# Altium footprint library pi4.PcbLib: 46 footprints (part 2 of 3)
Each footprint in its own frame and in the unit in brackets; x right, y up, seen from the top. Pads: shape width x height; smd on the part's side, far side on the other; paste and mask are expansions set on the pad; w line width, h text height; cw(c..) or ccw(c..) is an arc to the next point about the centre after c.
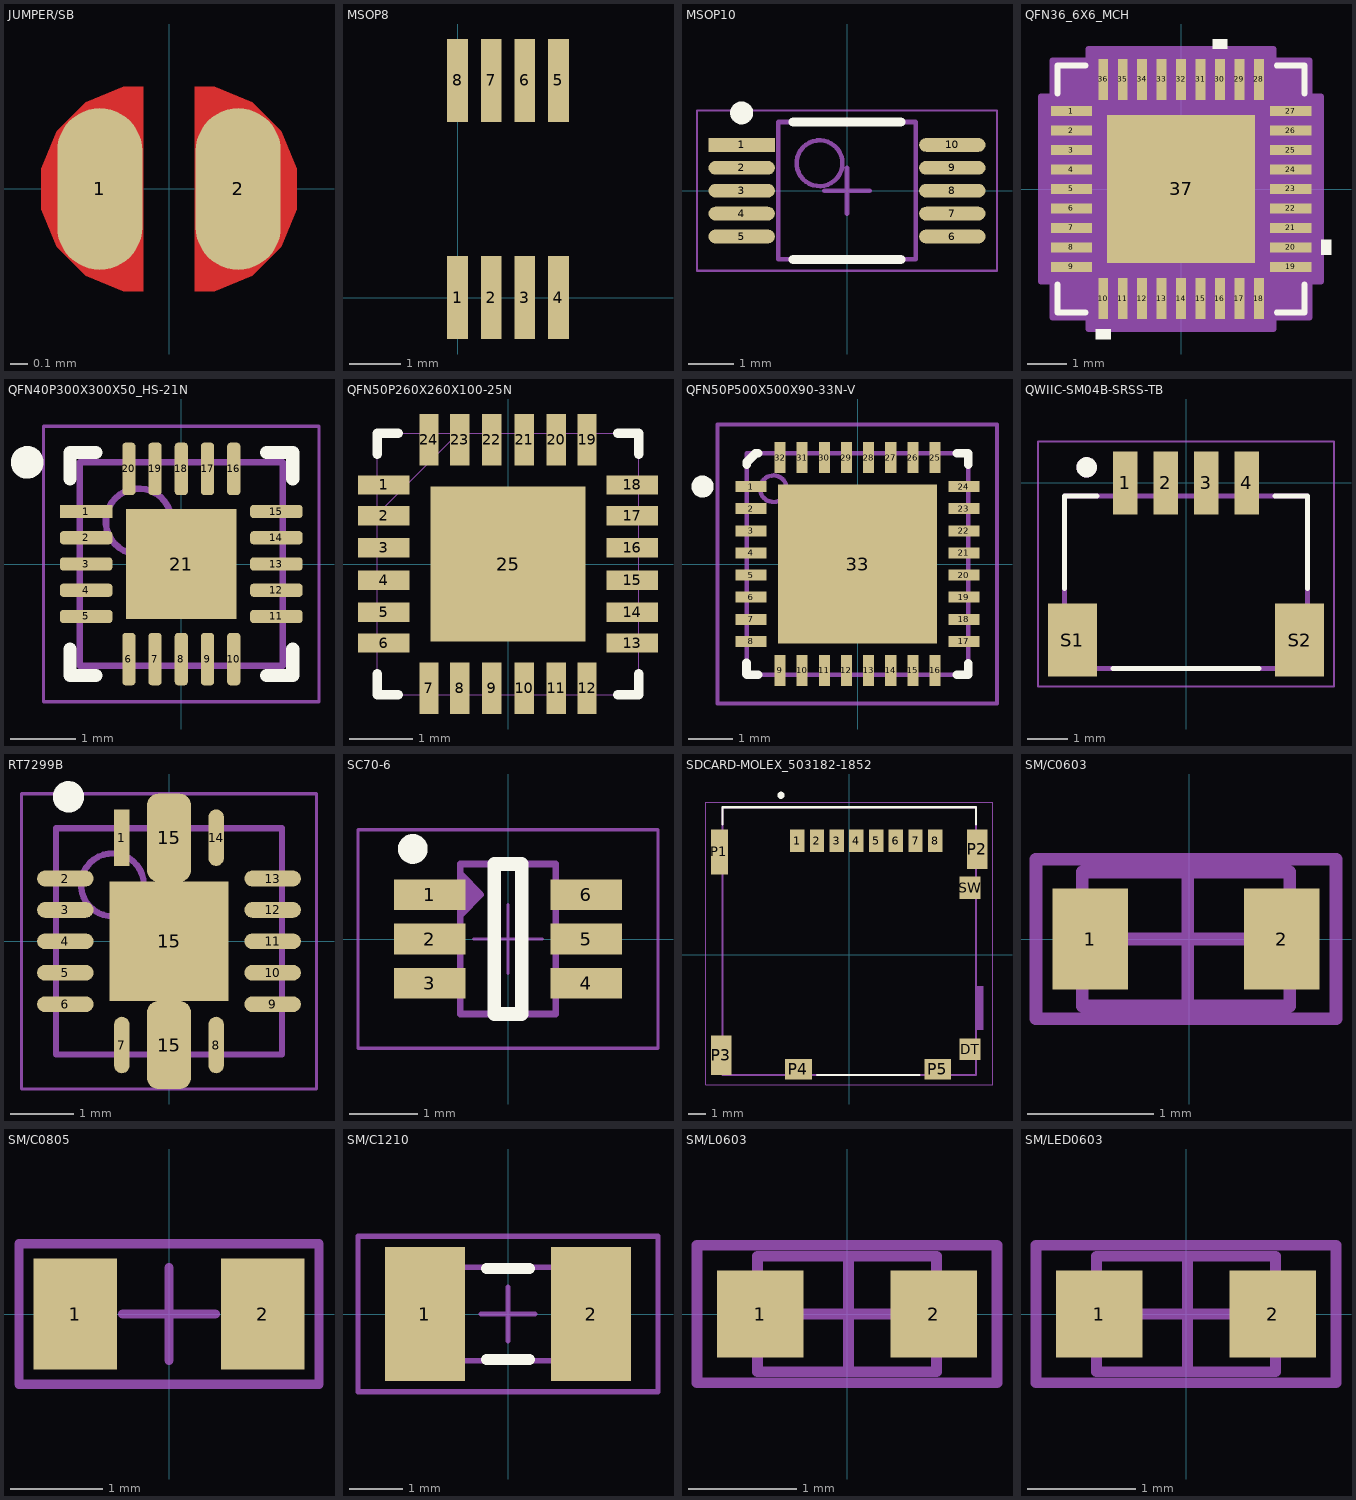
[diagram p1: the footprints below, top view; thin cyan lines are the x and y axes]

## JUMPER/SB [mm]
height 1
pads (2):
  oval 0.5x0.95 smd mask+0.102: 1(-0.406,0) 2(0.406,0)
Top Layer:
  region: 0.15,-0.6 0.269,-0.6 0.49,-0.509 0.659,-0.34 0.75,-0.119 0.75,0.119 0.659,0.34 0.49,0.509 0.269,0.6 0.15,0.6
  region: -0.15,0.6 -0.269,0.6 -0.49,0.509 -0.659,0.34 -0.75,0.119 -0.75,-0.119 -0.659,-0.34 -0.49,-0.509 -0.269,-0.6 -0.15,-0.6
Top Solder:
  region: -0.147,-0.7 0.156,-0.7 0.15,-0.7 0.242,-0.7 0.42,-0.652 0.58,-0.56 0.71,-0.43 0.802,-0.27 0.85,-0.092 0.85,0.092 0.802,0.27 0.71,0.43 0.58,0.56 0.42,0.652 0.242,0.7 0.15,0.7 0.158,0.699 -0.146,0.699 -0.15,0.7 -0.242,0.7 -0.42,0.652 -0.58,0.56 -0.71,0.43 -0.802,0.27 -0.85,0.092 -0.85,-0.092 -0.802,-0.27 -0.71,-0.43 -0.58,-0.56 -0.42,-0.652 -0.242,-0.7 -0.15,-0.7

## MSOP8 [mm]
pads (8):
  rect 0.4x1.6 smd: 1(0,0) 2(0.65,0) 3(1.3,0) 4(1.95,0) 5(1.95,4.2) 6(1.3,4.2) 7(0.65,4.2) 8(0,4.2)
3D body "MSOP8.STEP": height 1.15, standoff 0, extent -0.535,-0.342 2.465,4.558

## MSOP10 [mm] "TSSOP, 10-Leads, Body 3.00x3.00mm, Pitch 0.50mm, Thermal Pad 1.68.2x1.68.2mm, IPC Medium Density"
height 1.1
pads (10):
  rect 1.45x0.3 smd: 1(-2.3,1)
  oval 1.45x0.3 smd: 2(-2.3,0.5) 3(-2.3,0) 4(-2.3,-0.5) 5(-2.3,-1) 6(2.3,-1) 7(2.3,-0.5) 8(2.3,0) 9(2.3,0.5) 10(2.3,1)
Top Overlay:
  circle w0.25: c-2.3,1.7 r0.125
  lines w0.2: -1.175,-1.5 1.175,-1.5 ; -1.175,1.5 1.175,1.5
Mechanical 13:
  circle w0.1: c-0.6,0.6 r0.5
  lines w0.1: -1.5,-1.5 -1.5,1.5 1.5,1.5 1.5,-1.5 -1.5,-1.5
Mechanical 15:
  lines w0.05: -3.275,-1.75 -3.275,1.75 3.275,1.75 3.275,-1.75 -3.275,-1.75
  lines w0.1: -0.5,0 0.5,0 ; 0,-0.5 0,0.5
3D body "MSOP10.STEP": height 1.15, standoff 0, extent -2.45,-1.5 2.45,1.5

## QFN36_6X6_MCH [mm]
pads (37):
  rect 1.062x0.255 smd paste+0 mask+0: 1(-2.817,2) 2(-2.817,1.5) 3(-2.817,1) 4(-2.817,0.5) 5(-2.817,0) 6(-2.817,-0.5) 7(-2.817,-1) 8(-2.817,-1.5) 9(-2.817,-2) 19(2.817,-2) 20(2.817,-1.5) 21(2.817,-1) 22(2.817,-0.5) 23(2.817,0) 24(2.817,0.5) 25(2.817,1) 26(2.817,1.5) 27(2.817,2)
  rect 0.255x1.062 smd paste+0 mask+0: 10(-2,-2.817) 11(-1.5,-2.817) 12(-1,-2.817) 13(-0.5,-2.817) 14(0,-2.817) 15(0.5,-2.817) 16(1,-2.817) 17(1.5,-2.817) 18(2,-2.817) 28(2,2.817) 29(1.5,2.817) 30(1,2.817) 31(0.5,2.817) 32(0,2.817) 33(-0.5,2.817) 34(-1,2.817) 35(-1.5,2.817) 36(-2,2.817)
  rect 3.81x3.81 smd paste-1.892 mask+0: 37(0,0)
Top Overlay:
  region: 1.191,3.602 0.81,3.602 0.81,3.856 1.191,3.856
  region: 3.602,-1.309 3.856,-1.309 3.856,-1.69 3.602,-1.69
  region: -1.81,-3.602 -2.191,-3.602 -2.191,-3.856 -1.81,-3.856
  lines w0.152: -3.175,-2.46 -3.175,-3.175 -2.46,-3.175 ; -3.175,2.46 -3.175,3.175 -2.46,3.175 ; 2.46,-3.175 3.175,-3.175 3.175,-2.46 ; 2.46,3.175 3.175,3.175 3.175,2.46
Top Paste:
  region: 1.805,1.805 0.735,1.805 0.735,0.735 1.805,0.735
  region: 0.535,1.805 -0.535,1.805 -0.535,0.735 0.535,0.735
  region: 1.805,0.535 0.735,0.535 0.735,-0.535 1.805,-0.535
  region: 1.805,-0.735 0.735,-0.735 0.735,-1.805 1.805,-1.805
  region: 0.535,0.535 -0.535,0.535 -0.535,-0.535 0.535,-0.535
  region: -0.735,0.535 -1.805,0.535 -1.805,-0.535 -0.735,-0.535
  region: -0.735,1.805 -1.805,1.805 -1.805,0.735 -0.735,0.735
  region: 0.535,-0.735 -0.535,-0.735 -0.535,-1.805 0.535,-1.805
  region: -0.735,-0.735 -1.805,-0.735 -1.805,-1.805 -0.735,-1.805
Mechanical 13:
  lines w0.025: -3.048,1.778 -1.778,3.048 ; -3.048,-3.048 3.048,-3.048 3.048,3.048 -3.048,3.048 -3.048,-3.048 ; -3.048,-2.152 -3.048,-1.848 -3.048,-2.152 ; -3.048,-1.652 -3.048,-1.348 -3.048,-1.652 ; -3.048,-1.152 -3.048,-0.848 -3.048,-1.152 ; -3.048,-0.652 -3.048,-0.348 -3.048,-0.652 ; -3.048,-0.152 -3.048,0.152 -3.048,-0.152 ; -3.048,0.348 -3.048,0.652 -3.048,0.348 ; -3.048,0.848 -3.048,1.152 -3.048,0.848 ; -3.048,1.348 -3.048,1.652 -3.048,1.348 ; -3.048,1.848 -3.048,2.152 -3.048,1.848 ; -2.152,-3.048 -1.848,-3.048 -2.152,-3.048 ; -2.152,3.048 -1.848,3.048 -2.152,3.048 ; -1.652,-3.048 -1.348,-3.048 -1.652,-3.048 ; -1.652,3.048 -1.348,3.048 -1.652,3.048 ; -1.152,-3.048 -0.848,-3.048 -1.152,-3.048 ; -1.152,3.048 -0.848,3.048 -1.152,3.048 ; -0.652,-3.048 -0.348,-3.048 -0.652,-3.048 ; -0.652,3.048 -0.348,3.048 -0.652,3.048 ; -0.152,-3.048 0.152,-3.048 -0.152,-3.048 ; -0.152,3.048 0.152,3.048 -0.152,3.048 ; 0.348,-3.048 0.652,-3.048 0.348,-3.048 ; 0.348,3.048 0.652,3.048 0.348,3.048 ; 0.848,-3.048 1.152,-3.048 0.848,-3.048 ; 0.848,3.048 1.152,3.048 0.848,3.048 ; 1.348,-3.048 1.652,-3.048 1.348,-3.048 ; 1.348,3.048 1.652,3.048 1.348,3.048 ; 1.848,-3.048 2.152,-3.048 1.848,-3.048 ; 1.848,3.048 2.152,3.048 1.848,3.048 ; 3.048,-2.152 3.048,-1.848 3.048,-2.152 ; 3.048,-1.652 3.048,-1.348 3.048,-1.652 ; 3.048,-1.152 3.048,-0.848 3.048,-1.152 ; 3.048,-0.652 3.048,-0.348 3.048,-0.652 ; 3.048,-0.152 3.048,0.152 3.048,-0.152 ; 3.048,0.348 3.048,0.652 3.048,0.348 ; 3.048,0.848 3.048,1.152 3.048,0.848 ; 3.048,1.348 3.048,1.652 3.048,1.348 ; 3.048,1.848 3.048,2.152 3.048,1.848
  text "*" at -2.603,1.615 h1.27
Mechanical 15:
  region: -2.381,-3.302 -3.302,-3.302 -3.302,-2.381 -3.602,-2.381 -3.602,2.381 -3.302,2.381 -3.302,3.302 -2.381,3.302 -2.381,3.602 2.381,3.602 2.381,3.302 3.302,3.302 3.302,2.381 3.602,2.381 3.602,-2.381 3.302,-2.381 3.302,-3.302 2.381,-3.302 2.381,-3.602 -2.381,-3.602
  lines w0.152: -3.602,-2.381 -3.602,2.381 -3.302,2.381 -3.302,3.302 -2.381,3.302 -2.381,3.602 2.381,3.602 2.381,3.302 3.302,3.302 3.302,2.381 3.602,2.381 3.602,-2.381 3.302,-2.381 3.302,-3.302 2.381,-3.302 2.381,-3.602 -2.381,-3.602 -2.381,-3.302 -3.302,-3.302 -3.302,-2.381 -3.602,-2.381
3D body: height 0.25, standoff 0, extent 0,0 0.254,0.254
3D body "SQFN36_6X6_MCH.STEP": height 0.99, standoff 0, extent -3.048,-3.048 3.048,3.048

## QFN40P300X300X50_HS-21N [mm] "QFN, 20-Leads, Body 3.00x3.00mm, Pitch 0.40mm, Thermal Pad 1.68x1.68mm, IPC Medium Density"
height 0.5
pads (21):
  rect 0.8x0.2 smd: 1(-1.45,0.8)
  rrect50% 0.8x0.2 smd: 2(-1.45,0.4) 3(-1.45,0) 4(-1.45,-0.4) 5(-1.45,-0.8) 11(1.45,-0.8) 12(1.45,-0.4) 13(1.45,0) 14(1.45,0.4) 15(1.45,0.8)
  rrect50% 0.2x0.8 smd: 6(-0.8,-1.45) 7(-0.4,-1.45) 8(0,-1.45) 9(0.4,-1.45) 10(0.8,-1.45) 16(0.8,1.45) 17(0.4,1.45) 18(0,1.45) 19(-0.4,1.45) 20(-0.8,1.45)
  rect 1.68x1.68 smd: 21(0,0)
Top Overlay:
  circle w0.25: c-2.35,1.55 r0.125
  lines w0.2: -1.7,-1.3 -1.7,-1.7 -1.3,-1.7 ; -1.7,1.3 -1.7,1.7 -1.3,1.7 ; 1.3,-1.7 1.7,-1.7 1.7,-1.3 ; 1.3,1.7 1.7,1.7 1.7,1.3
Mechanical 13:
  circle w0.1: c-0.65,0.65 r0.5
  lines w0.1: -1.55,-1.55 1.55,-1.55 1.55,1.55 -1.55,1.55 -1.55,-1.55
Mechanical 15:
  lines w0.05: -2.1,-2.1 2.1,-2.1 2.1,2.1 -2.1,2.1 -2.1,-2.1
  lines w0.1: -0.5,0 0.5,0 ; 0,-0.5 0,0.5
3D body "User Library-QFN-20-2.step": height 0.75, standoff 0, extent -1.524,-1.524 1.496,1.496

## QFN50P260X260X100-25N [mil]
pads (25):
  rect 32x12 smd: 1(-77,49) 2(-77,30) 3(-77,10) 4(-77,-10) 5(-77,-30) 6(-77,-49) 13(77,-49) 14(77,-30) 15(77,-10) 16(77,10) 17(77,30) 18(77,49)
  rect 12x32 smd: 7(-49,-77) 8(-30,-77) 9(-10,-77) 10(10,-77) 11(30,-77) 12(49,-77) 19(49,77) 20(30,77) 21(10,77) 22(-10,77) 23(-30,77) 24(-49,77)
  rect 96x96 smd: 25(0,0)
Top Overlay:
  lines w6: -81,-68 -81,-81 -68,-81 ; -81,68 -81,81 -68,81 ; 68,-81 81,-81 81,-68 ; 68,81 81,81 81,68
Mechanical 13:
  lines w0: -81,-55 -81,-43 ; -81,-35 -81,-24 ; -81,-16 -81,-4 ; -81,4 -81,16 ; -81,24 -81,35 ; -81,31 -31,81 ; -81,43 -81,55 ; -55,-81 -43,-81 ; -55,81 -43,81 ; -35,-81 -24,-81 ; -35,81 -24,81 ; -16,-81 -4,-81 ; -16,81 -4,81 ; 4,-81 16,-81 ; 4,81 16,81 ; 24,-81 35,-81 ; 24,81 35,81 ; 43,-81 55,-81 ; 43,81 55,81 ; 81,-55 81,-43 ; 81,-35 81,-24 ; 81,-16 81,-4 ; 81,4 81,16 ; 81,24 81,35 ; 81,43 81,55 ; -81,-81 81,-81 81,81 -81,81 -81,-81
3D body "User Library-QFN24-0_5.STEP": height 39.37, standoff 0, extent -78.74,-78.74 78.74,78.74

## QFN50P500X500X90-33N-V [mm]
pads (33):
  rect 0.7x0.25 smd: 1(-2.4,1.75) 2(-2.4,1.25) 3(-2.4,0.75) 4(-2.4,0.25) 5(-2.4,-0.25) 6(-2.4,-0.75) 7(-2.4,-1.25) 8(-2.4,-1.75) 17(2.4,-1.75) 18(2.4,-1.25) 19(2.4,-0.75) 20(2.4,-0.25) 21(2.4,0.25) 22(2.4,0.75) 23(2.4,1.25) 24(2.4,1.75)
  rect 0.25x0.7 smd: 9(-1.75,-2.4) 10(-1.25,-2.4) 11(-0.75,-2.4) 12(-0.25,-2.4) 13(0.25,-2.4) 14(0.75,-2.4) 15(1.25,-2.4) 16(1.75,-2.4) 25(1.75,2.4) 26(1.25,2.4) 27(0.75,2.4) 28(0.25,2.4) 29(-0.25,2.4) 30(-0.75,2.4) 31(-1.25,2.4) 32(-1.75,2.4)
  rect 3.6x3.6 smd: 33(0,0)
Top Overlay:
  circle w0.25: c-3.5,1.75 r0.125
  lines w0.2: -2.504,-2.487 -2.504,-2.237 ; -2.5,-2.5 -2.25,-2.5 ; -2.5,2.25 -2.5,2.3 -2.3,2.5 -2.25,2.5 ; 2.25,-2.5 2.5,-2.5 2.5,-2.25 ; 2.25,2.5 2.5,2.5 2.5,2.25
Mechanical 13:
  circle w0.1: c-1.9,1.7 r0.3
  lines w0.1: -2.504,-2.5 -2.504,2.5 ; -2.5,-2.5 2.5,-2.5 2.5,2.5 -2.5,2.5 ; -0.5,0 0.5,0 ; 0,-0.5 0,0.5
Mechanical 15:
  lines w0.1: -3.162,-3.15 -3.162,3.15 ; -3.15,-3.15 3.15,-3.15 3.15,3.15 -3.15,3.15
3D body "ATSAMC21E15A-MUT.STEP": height 1, standoff 0, extent -2.5,-2.5 2.5,2.5

## QWIIC-SM04B-SRSS-TB [mm]
pads (6):
  rect 0.6x1.55 smd: 1(-1.5,0) 2(-0.5,0) 3(0.5,0) 4(1.5,0)
  rect 1.2x1.8 smd: S1(-2.8,-3.875) S2(2.8,-3.875)
Top Overlay:
  circle w0.3: c-2.45,0.385 r0.1
  lines w0.127: -3,-2.6 -3,-0.325 -2.2,-0.325 ; -1.8,-4.575 1.8,-4.575 ; 2.2,-0.325 3,-0.325 3,-2.6
Mechanical 13:
  circle w0.3: c-2.45,0.385 r0.1
  lines w0.127: -3,-4.575 3,-4.575 3,-0.325 -3,-0.325 -3,-4.575
Mechanical 15:
  lines w0.05: -3.65,-5.025 3.65,-5.025 3.65,1.025 -3.65,1.025 -3.65,-5.025
3D body "QWIIC-SM04B-SRSS-TB.STEP": height 2.94, standoff -0.02, extent -3,-4.657 3,0.293

## RT7299B [mm]
height 0.8
pads (17):
  rect 0.25x0.9 smd: 1(-0.75,1.65)
  oval 0.9x0.25 smd: 2(-1.65,1) 3(-1.65,0.5) 4(-1.65,0) 5(-1.65,-0.5) 6(-1.65,-1) 9(1.65,-1) 10(1.65,-0.5) 11(1.65,0) 12(1.65,0.5) 13(1.65,1)
  oval 0.25x0.9 smd: 7(-0.75,-1.65) 8(0.75,-1.65) 14(0.75,1.65)
  rrect50% 0.7x1.4 smd: 15(0,-1.65) 15(0,1.65)
  rect 1.9x1.9 smd: 15(0,0)
Top Overlay:
  circle w0.25: c-1.6,2.3 r0.125
Mechanical 13:
  circle w0.1: c-0.9,0.9 r0.5
  lines w0.1: -1.8,-1.8 -1.8,1.8 1.8,1.8 1.8,-1.8 -1.8,-1.8
Mechanical 15:
  lines w0.05: -2.35,-2.35 -2.35,2.35 2.35,2.35 2.35,-2.35 -2.35,-2.35
  lines w0.1: -0.5,0 0.5,0 ; 0,-0.5 0,0.5
3D body "WQFN3.5x3.5.STEP": height 0.82, standoff 0.01, extent -1.75,-1.75 1.75,1.75

## SC70-6 [mm] "SOT363, 6-Leads, Body 2x1.3mm, Pitch 0.65mm, Lead Span 2.1mm, IPC Low Density"
height 1.1
pads (6):
  rect 1.05x0.45 smd: 1(-1.15,0.65) 2(-1.15,0) 3(-1.15,-0.65) 4(1.15,-0.65) 5(1.15,0) 6(1.15,0.65)
Top Overlay:
  circle w0.254: c-1.397,1.321 r0.092
  lines w0.2: -0.2,-1.1 0.2,-1.1 0.2,1.1 -0.2,1.1 -0.2,-1.1
Mechanical 13:
  lines w0.1: -0.7,0.35 -0.4,0.65 -0.7,0.95 ; -0.7,0.45 -0.5,0.65 -0.7,0.85 ; -0.7,0.55 -0.6,0.65 -0.7,0.75 ; -0.7,-1.1 0.7,-1.1 0.7,1.1 -0.7,1.1 -0.7,-1.1
Mechanical 15:
  lines w0.05: -0.5,0 0,0 ; 0,-0.5 0,0 ; 0,0.5 0,0 ; 0.5,0 0,0 ; -2.2,-1.6 2.2,-1.6 2.2,1.6 -2.2,1.6 -2.2,-1.6
3D body "SC-70-6.STEP": height 1.1, standoff -0.01, extent -1.15,-1.132 1.1,1.118

## SDCARD-MOLEX_503182-1852 [mm]
pads (15):
  rect 0.8x1.24 smd: 1(-2.9,6.355) 2(-1.8,6.355) 3(-0.7,6.355) 4(0.4,6.355) 5(1.5,6.355) 6(2.6,6.355) 7(3.7,6.355) 8(4.8,6.355)
  rect 1.16x1.2 smd: DT(6.74,-5.275)
  rect 0.95x2.5 smd: P1(-7.245,5.725)
  rect 1.15x2.2 smd: P2(7.145,5.875) P3(-7.145,-5.605)
  rect 1.5x1.15 smd: P4(-2.84,-6.4) P5(4.94,-6.4)
  rect 1.16x1.25 smd: SW(6.74,3.725)
Top Overlay:
  circle w0.2: c-3.81,8.89 r0.1
  lines w0.127: -7.07,7.28 -7.07,8.225 7.07,8.225 7.07,7.28 ; -1.8,-6.725 3.9,-6.725
Mechanical 13:
  lines w0.127: -7.07,-6.725 -7.07,8.225 7.07,8.225 7.07,-6.725 -7.07,-6.725
Mechanical 15:
  region: 7.47,-4.184 7.085,-4.184 7.085,-1.775 7.47,-1.775
  lines w0.05: -8,-7.25 -8,8.5 8,8.5 8,-7.25 -8,-7.25
3D body "5031821852.STEP": height 1.36, standoff -0.14, extent -7.447,-6.713 7.493,8.237

## SM/C0603 [mm] "Chip Capacitor, Body 1.6x0.8mm, IPC Low Density"
height 0.6
pads (2):
  rect 0.6x0.8 smd: 1(-0.787,0) 2(0.737,0)
Mechanical 13:
  lines w0.1: -0.851,-0.533 0.8,-0.533 0.8,0.533 -0.851,0.533 -0.851,-0.533
Mechanical 15:
  lines w0.1: -0.488,0 0.462,0 ; -0.013,-0.475 -0.013,0.475 ; -1.219,-0.635 -1.219,0.635 1.168,0.635 1.168,-0.635 -1.219,-0.635
3D body "SM-C603.STEP": height 0.6, standoff 0, extent -0.825,-0.4 0.775,0.4

## SM/C0805 [mm] "Chip Resistor, Body 2.0x1.3mm, IPC Low Density"
height 0.65
pads (2):
  rect 0.9x1.2 smd: 1(-1.016,0) 2(1.016,0)
Mechanical 15:
  lines w0.1: -0.5,0 0.5,0 ; 0,-0.5 0,0.5 ; -1.626,-0.762 1.626,-0.762 1.626,0.762 -1.626,0.762 -1.626,-0.762
3D body "User Library-cap_0805-1.STEP": height 1.2, standoff 0, extent -1,-0.59 1,0.61

## SM/C1210 [mm] "Chip Resistor, Body 3.2x1.6mm, IPC Low Density"
height 0.71
pads (2):
  rect 1.5x2.5 smd: 1(-1.55,0) 2(1.55,0)
Top Overlay:
  lines w0.2: -0.4,-0.85 0.4,-0.85 ; -0.4,0.85 0.4,0.85
Mechanical 13:
  lines w0.1: -1.675,-0.875 1.675,-0.875 1.675,0.875 -1.675,0.875 -1.675,-0.875
Mechanical 15:
  lines w0.1: -0.5,0 0.5,0 ; 0,-0.5 0,0.5 ; -2.8,-1.45 2.8,-1.45 2.8,1.45 -2.8,1.45 -2.8,-1.45
3D body "1210.STEP": height 2.5, standoff 0, extent -1.651,-1.245 1.549,1.255

## SM/L0603 [mm] "Chip Capacitor, Body 1.6x0.8mm, IPC Low Density"
height 0.6
pads (2):
  rect 0.8x0.8 smd: 1(-0.8,0) 2(0.8,0)
Mechanical 13:
  lines w0.1: -0.826,-0.533 0.826,-0.533 0.826,0.533 -0.826,0.533 -0.826,-0.533
Mechanical 15:
  lines w0.1: -0.462,0 0.488,0 ; 0.013,-0.475 0.013,0.475 ; -1.384,-0.635 -1.384,0.635 1.384,0.635 1.384,-0.635 -1.384,-0.635
3D body "SM-L0603.STEP": height 0.45, standoff 0, extent -0.774,-0.393 0.826,0.407

## SM/LED0603 [mm] "Chip Capacitor, Body 1.6x0.8mm, IPC Low Density"
height 0.6
pads (2):
  rect 0.8x0.8 smd: 1(-0.8,0) 2(0.8,0)
Mechanical 13:
  lines w0.1: -0.826,-0.533 0.826,-0.533 0.826,0.533 -0.826,0.533 -0.826,-0.533
Mechanical 15:
  lines w0.1: -0.462,0 0.488,0 ; 0.013,-0.475 0.013,0.475 ; -1.384,-0.635 1.384,-0.635 1.384,0.635 -1.384,0.635 -1.384,-0.635
3D body "XZxx53-1.STEP": height 0.73, standoff -0.02, extent -0.775,-0.401 0.836,0.401